# Altium footprint library PCB_Lib_Devzone.PcbLib: 491 footprints (part 6 of 31)
Each footprint in its own frame and in the unit in brackets; x right, y up, seen from the top. Pads: shape width x height; smd on the part's side, far side on the other; paste and mask are expansions set on the pad; w line width, h text height; cw(c..) or ccw(c..) is an arc to the next point about the centre after c.
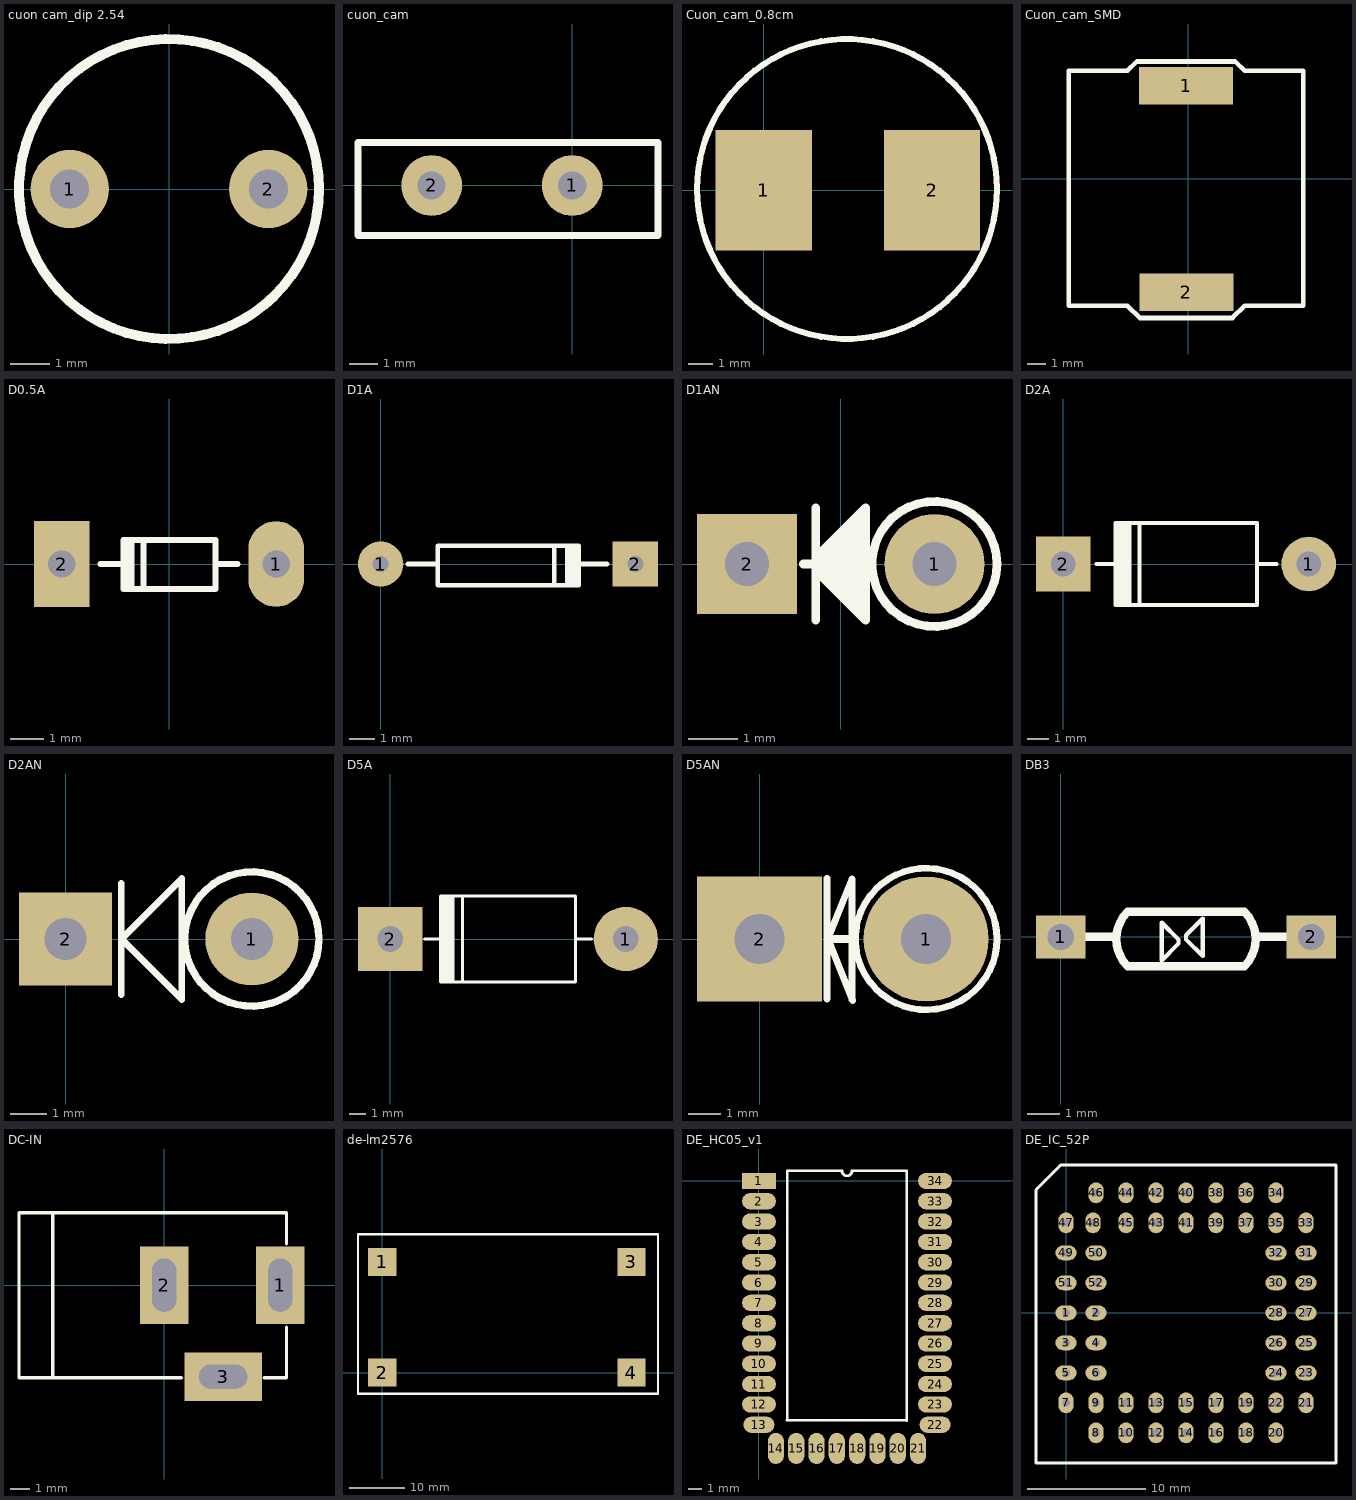
[diagram p5: the footprints below, top view; thin cyan lines are the x and y axes]

## cuon cam_dip 2.54 [mm]
pads (2):
  round 2 hole 1: 1(-2.54,0) 2(2.54,0)
Top Overlay:
  circle w0.254: c0,0 r3.835

## cuon_cam [mil]
pads (2):
  round 85 hole 39.37: 1(0,0) 2(-196.85,0)
Top Overlay:
  lines w10: -300,-70 120,-70 120,60 -300,60 -300,-50 -300,-70
3D body "User Library-D=0_45_INDUCTOR.STEP": height 158.2, standoff -31.69, extent -305.42,-107.42 120.28,82.46

## Cuon_cam_0.8cm [mm]
pads (2):
  rect 4x5 all layers, no hole: 1(0,0) 2(7,0)
Top Overlay:
  circle w0.254: c3.462,0.051 r6.24

## Cuon_cam_SMD [mil]
pads (2):
  rect 200x80 smd: 1(-5,198) 2(-4,-242)
Top Overlay:
  lines w10: -255,-271 -130,-271 -104,-297 94,-297 120,-271 245,-271 245,230 120,230 100,250 -110,250 -130,230 -255,230 -255,-271

## D0.5A [mil] "Diode muoi, W 80mil, L 300mil"
height 80
pads (2):
  oval 65x100 hole 32: 1(125,0)
  rect 65x100 hole 32: 2(-125,0)
Top Overlay:
  rectangle: -55,-30 -40,25
  lines w7: -80,0 -53,0 ; -30,-29 -30,28 ; 54,0 80,0 ; -53,-29 54,-29 54,28 -53,28 -53,-29
3D body "SW3dPS-1N4148.STEP": height 61.22, standoff -50, extent -108.5,-32.96 108.5,32

## D1A [mil] "Diode 1A, W 100mil, L 350mil"
height 100
pads (2):
  round 70 hole 25: 1(0,0)
  rect 70x70 hole 25: 2(393.7,0)
Top Overlay:
  region: 305,28 285,28 285,-35 305,-35
  lines w7: 42,0 88,0 ; 268,-29 268,25 ; 309,0 350,0 ; 88,-33 306,-33 306,28 88,28 88,-33

## D1AN [mil] "Diode 1A, W 100mil, L 150mil"
height 100
pads (2):
  round 80 hole 35: 1(75,0)
  rect 80x80 hole 35: 2(-75,0)
Top Overlay:
  circle w7: c75,0 r50
  region: 20,40 20,-40 15,-40 -20,-5 -20,5
  lines w7: -30,0 -20,0 ; -20,-45 -20,45 ; -20,-5 -20,5 20,45 20,-45 -20,-5
3D body "SW3dPS-1N4007_Stand.STEP": height 252.32, standoff -78.14, extent -64,-50 104,55

## D2A [mil] "Diode 2A, W 150mil, L 450mil"
height 100
pads (2):
  round 100 hole 45: 1(450,0)
  rect 100x100 hole 45: 2(0,0)
Top Overlay:
  rectangle: 95,-75 125,75
  lines w7: 61,0 96,0 ; 96,-31 96,0 ; 96,32 96,0 ; 140,-75 140,75 ; 355,0 391,0 ; 96,-75 96,75 355,75 355,-75 96,-75
3D body "SW3DPS-DIODE0_4-DEFAULT.STEP": height 100.5, standoff -100, extent 5,-47 435,54

## D2AN [mil] "Diode 2A, W 150mil, L 450mil"
height 100
pads (2):
  round 100 hole 45: 1(200,0)
  rect 100x100 hole 45: 2(0,0)
Top Overlay:
  circle w8: c200,0 r72.11
  lines w7: 60,-60 60,60 ; 125,50 125,65 60,0 125,-65 125,55
3D body "SW3dPS-Zener 1W_Stand.STEP": height 252.32, standoff -78.14, extent 46.01,-49.99 214.01,55

## D5A [mil] "Diode 5A, W 200mil, L 550mil"
height 150
pads (2):
  round 150 hole 60: 1(550,0)
  rect 150x150 hole 60: 2(0,0)
Top Overlay:
  rectangle: 120,-100 150,100
  lines w7: 80,0 118,0 ; 118,-44 118,0 ; 118,46 118,0 ; 169,-99 169,100 ; 432,0 470,0 ; 118,-100 118,100 432,100 432,-100 118,-100
3D body "SW3dPS-BYW98.STEP": height 254.33, standoff -86.22, extent -51.87,-106 589.87,102.66

## D5AN [mil] "Diode 5A, W 200mil, L 250mil"
height 150
pads (2):
  round 150 hole 60: 1(200,0)
  rect 150x150 hole 60: 2(0,0)
Top Overlay:
  circle w8: c200,0 r85
  lines w8: 81,-72 81,73 ; 82,0 111,72 111,-73 ; 83,-2 112,-74
  lines w10: 82,0 113,0
3D body "SW3dPS-Zener 1W_Stand.STEP": height 252.32, standoff -78.14, extent 21,-73.99 189,31

## DB3 [mm]
pads (2):
  rect 1.5x1.3 hole 0.8: 1(0,0) 2(7.62,0)
Top Overlay:
  lines w0.127: 3.073,-0.711 3.581,-0.203 3.581,-0.076 3.073,0.432 3.073,-0.711 ; 3.81,-0.076 3.81,0.051 4.318,0.559 4.318,-0.584 3.81,-0.076
  lines w0.254: 0.635,0 1.651,0 ; 5.969,0 7.112,0 ; 2.032,-0.889 cw(c2.857,-0.064) 2.032,0.762 5.588,0.762 cw(c4.763,-0.064) 5.588,-0.889 2.032,-0.889

## DC-IN [mil] "Jac DC input"
height 200
pads (3):
  rect 100x160 hole 50 slot 110.24 at 90 deg: 1(240.16,0) 2(0,0)
  rect 160x100 hole 50 slot 100 at 0 deg: 3(122.05,-188.98)
Top Overlay:
  lines w7: -230,-188 -230,150 ; 36,-191 -300,-191 -300,150 253,150 253,86 ; 207,-191 253,-191 253,-87
3D body "SW3dPS-dc range - dc connector[4840.2201].STEP": height 433.67, standoff -137.2, extent -299.35,-198.12 245,176.12

## de-lm2576 [mil]
pads (4):
  rect 200x200 hole 20: 1(0,787.4) 2(0,0) 3(1771.65,787.4) 4(1771.65,0)
Top Overlay:
  lines w17: -172,-151 1960,-151 1960,985 -111,985 -172,985 -172,-151

## DE_HC05_v1 [mm]
pads (34):
  rect 2.5x1.2 smd: 1(0,0)
  oval 2.5x1.2 smd: 2(0,-1.5) 3(0,-3) 4(0,-4.5) 5(0,-6) 6(0,-7.5) 7(0,-9) 8(0,-10.5) 9(0,-12) 10(0,-13.5) 11(0,-15) 12(0,-16.5) 23(13,-16.5) 24(13,-15) 25(13,-13.5) 26(13,-12) 27(13,-10.5) 28(13,-9) 29(13,-7.5) 30(13,-6) 31(13,-4.5) 32(13,-3) 33(13,-1.5) 34(13,0)
  oval 2.297x1.2 smd: 13(0,-18) 22(13,-18)
  oval 1.2x2.297 smd: 14(1.25,-19.75) 15(2.75,-19.75) 16(4.25,-19.75) 17(5.75,-19.75) 18(7.25,-19.75) 19(8.75,-19.75) 20(10.25,-19.75) 21(11.75,-19.75)
Top Overlay:
  lines w0.2: 2.06,-17.675 10.89,-17.675 ; 2.085,-17.675 2.085,0.75 6.125,0.75 ccw(c6.5,0.75) 6.875,0.75 10.915,0.75 10.915,-17.7

## DE_IC_52P [mil]
pads (52):
  oval 70x50 hole 25: 1(0,0) 2(100,0) 3(0,-100) 4(100,-100) 5(0,-200) 6(100,-200) 23(800,-200) 24(700,-200) 25(800,-100) 26(700,-100) 27(800,0) 28(700,0) 29(800,100) 30(700,100) 31(800,200) 32(700,200) 49(0,200) 50(100,200) 51(0,100) 52(100,100)
  oval 50x70 hole 25: 7(0,-300) 8(100,-400) 9(100,-300) 10(200,-400) 11(200,-300) 12(300,-400) 13(300,-300) 14(400,-400) 15(400,-300) 16(500,-400) 17(500,-300) 18(600,-400) 19(600,-300) 20(700,-400) 21(800,-300) 22(700,-300) 33(800,300) 34(700,400) 35(700,300) 36(600,400) 37(600,300) 38(500,400) 39(500,300) 40(400,400) 41(400,300) 42(300,400) 43(300,300) 44(200,400) 45(200,300) 46(100,400) 47(0,300) 48(90,300)
Top Overlay:
  lines w10: -100,-500 900,-500 900,491.94 -18.06,491.94 -100,410 -100,-500
3D body "1571541-2.stp": height 300, standoff -189.76, extent -91.92,-491.92 891.94,491.94